# Altium footprint library ALL.PcbLib: 153 footprints (part 8 of 11)
Each footprint in its own frame and in the unit in brackets; x right, y up, seen from the top. Pads: shape width x height; smd on the part's side, far side on the other; paste and mask are expansions set on the pad; w line width, h text height; cw(c..) or ccw(c..) is an arc to the next point about the centre after c.
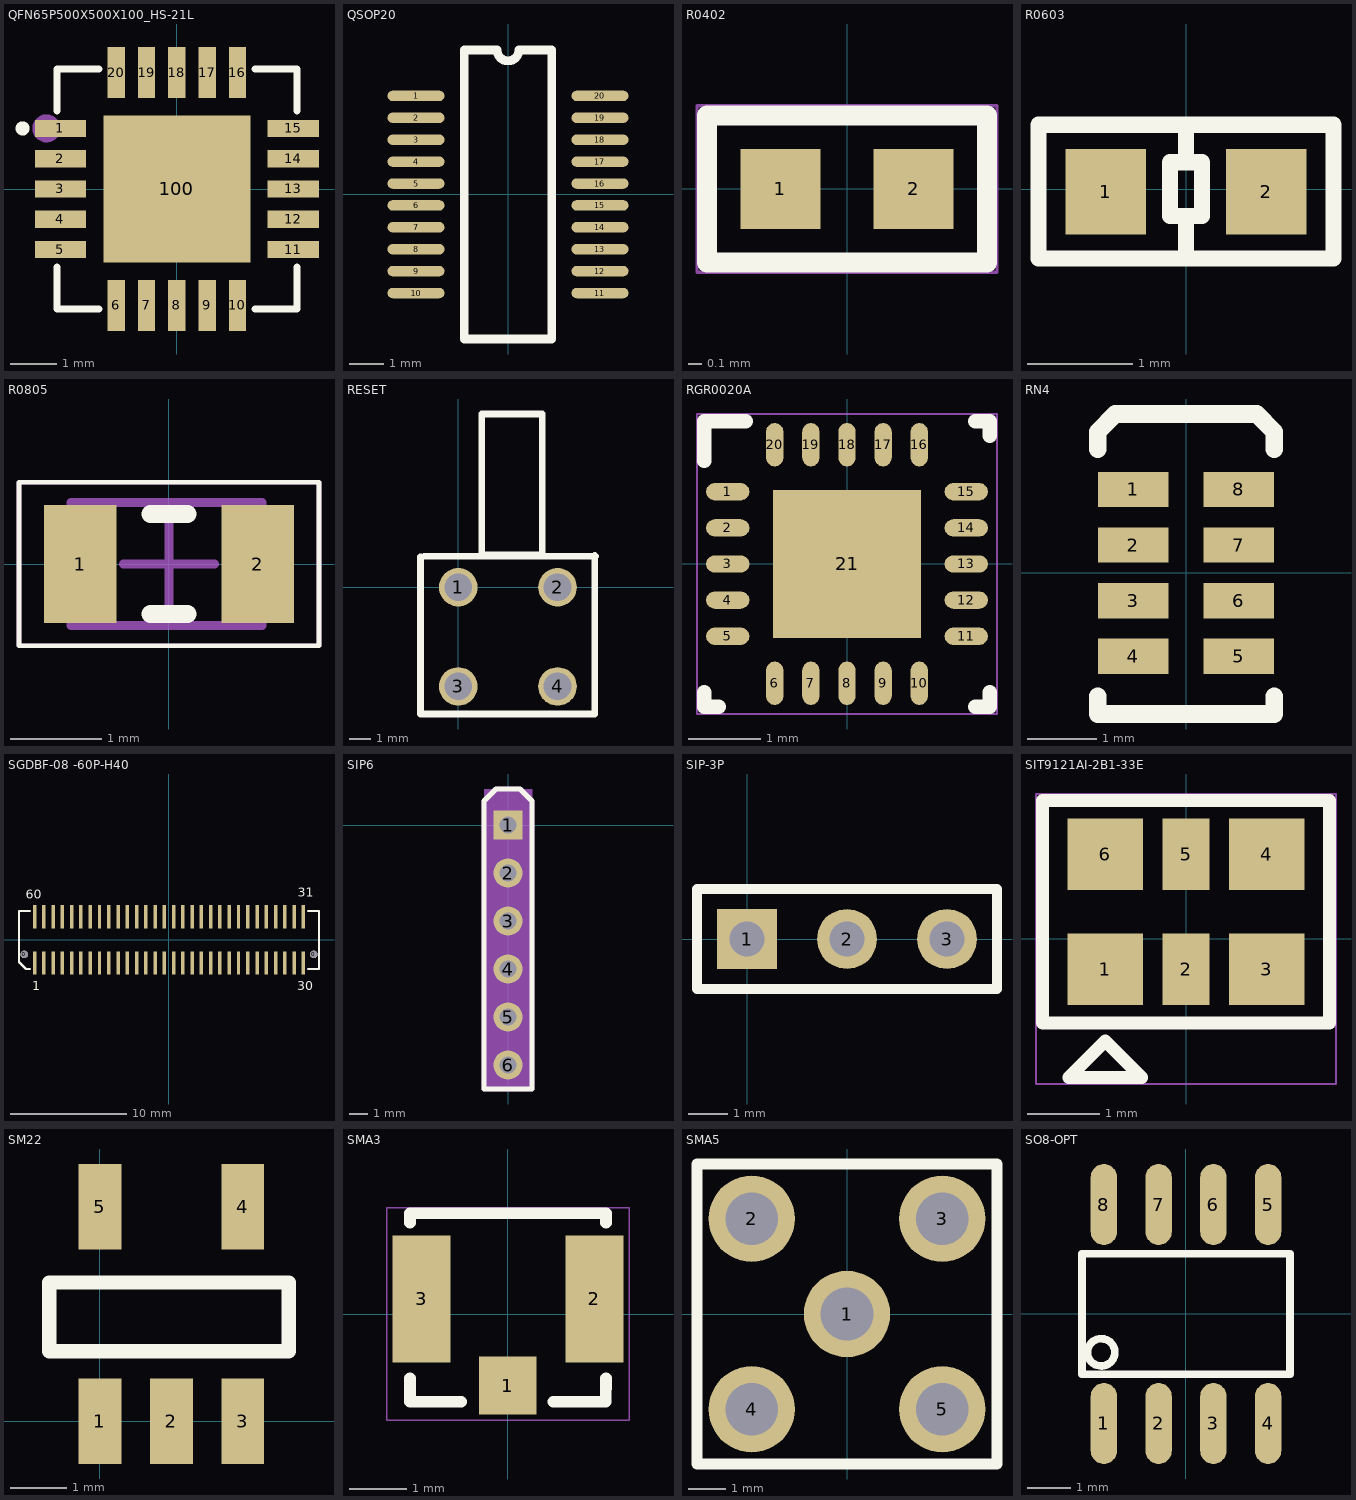
[diagram p7: the footprints below, top view; thin cyan lines are the x and y axes]

## QFN65P500X500X100_HS-21L [mm]
pads (21):
  rect 1.1x0.37 smd: 1(-2.5,1.3) 2(-2.5,0.65) 3(-2.5,0) 4(-2.5,-0.65) 5(-2.5,-1.3) 11(2.5,-1.3) 12(2.5,-0.65) 13(2.5,0) 14(2.5,0.65) 15(2.5,1.3)
  rect 0.37x1.1 smd: 6(-1.3,-2.5) 7(-0.65,-2.5) 8(0,-2.5) 9(0.65,-2.5) 10(1.3,-2.5) 16(1.3,2.5) 17(0.65,2.5) 18(0,2.5) 19(-0.65,2.5) 20(-1.3,2.5)
  rect 3.15x3.15 smd: 100(0,0)
Top Overlay:
  circle w0.153: c-3.312,1.3 r0.076
  lines w0.152: -2.576,-1.672 -2.576,-2.576 -1.673,-2.576 ; -2.576,1.673 -2.576,2.576 -1.673,2.576 ; 1.672,-2.576 2.576,-2.576 2.576,-1.672 ; 1.672,2.576 2.576,2.576 2.576,1.673
Top Paste:
  region: -1.26,1.26 1.26,1.26 1.26,-1.26 -1.26,-1.26
Mechanical 15:
  circle w0.3: c-2.8,1.3 r0.15

## QSOP20 [mil]
pads (20):
  oval 65x12 smd: 1(-105,112.5) 2(-105,87.5) 3(-105,62.5) 4(-105,37.5) 5(-105,12.5) 6(-105,-12.5) 7(-105,-37.5) 8(-105,-62.5) 9(-105,-87.5) 10(-105,-112.5) 11(105,-112.5) 12(105,-87.5) 13(105,-62.5) 14(105,-37.5) 15(105,-12.5) 16(105,12.5) 17(105,37.5) 18(105,62.5) 19(105,87.5) 20(105,112.5)
Top Overlay:
  lines w10: -50,-165 50,-165 50,165 12.5,165 cw(c0,165) -12.5,165 -50,165 -50,-165

## R0402 [mm] "R0402"
pads (2):
  rect 0.6x0.6 smd: 1(-0.5,0) 2(0.5,0)
Top Overlay:
  lines w0.15: -1.05,-0.55 1.05,-0.55 1.05,0.55 -1.05,0.55 -1.05,-0.55
  text ".Designator" at 2.667,-0.597 h0.76
Mechanical 7:
  lines w0.025: -1.125,-0.625 1.125,-0.625 1.125,0.625 -1.125,0.625 -1.125,-0.625

## R0603 [mil] "R0603"
pads (2):
  rect 30x32 smd: 1(-30,-1) 2(30,-1)
Top Overlay:
  lines w6: 0,-26 0,-11 ; 0,23 0,10 ; 0,10 -6,10 -6,-10 6,-10 6,10 0,10 ; -55,-26 55,-26 55,24 -55,24 -55,-26
Mechanical 7:
  lines w1: -56,-26 56,-26 56,26 -56,26 -56,-26
Mechanical 16:
  text ".Designator" at 0,-1 h30

## R0805 [mm]
height 0.5
pads (2):
  rect 0.8x1.3 smd: 1(-0.975,0) 2(0.975,0)
Top Overlay:
  lines w0.05: -1.65,-0.9 1.65,-0.9 1.65,0.9 -1.65,0.9 -1.65,-0.9
  lines w0.2: -0.2,-0.55 0.2,-0.55 ; -0.2,0.55 0.2,0.55
Mechanical 13:
  lines w0.1: -1.075,-0.675 -1.075,0.675 1.025,0.675 1.025,-0.675 -1.075,-0.675
Mechanical 15:
  lines w0.05: -1.65,-0.9 1.65,-0.9 1.65,0.9 -1.65,0.9 -1.65,-0.9
  lines w0.1: -0.5,0 0.5,0 ; 0,-0.5 0,0.5
3D body "R0805.STEP": height 0.55, standoff 0, extent -1.025,-0.63 0.975,0.63

## RESET [mil]
pads (4):
  round 70 / inner round 60 / far side round 60 hole 50: 1(0,0) 2(180,0)
  round 70 hole 50: 3(0,-180) 4(180,-180)
Top Overlay:
  lines w12: -68.68,55.49 -68.68,-230 247.8,-230 247.8,57.69 ; -62.09,56.59 248.9,56.59 ; 42.31,58.79 42.31,314.58 152.2,314.58 152.2,58.79 46.7,58.79

## RGR0020A [mm] "RGR0020A"
pads (21):
  oval 0.6x0.24 smd: 1(-1.65,1) 2(-1.65,0.5) 3(-1.65,0) 4(-1.65,-0.5) 5(-1.65,-1) 11(1.65,-1) 12(1.65,-0.5) 13(1.65,0) 14(1.65,0.5) 15(1.65,1)
  oval 0.24x0.6 smd: 6(-1,-1.65) 7(-0.5,-1.65) 8(0,-1.65) 9(0.5,-1.65) 10(1,-1.65) 16(1,1.65) 17(0.5,1.65) 18(0,1.65) 19(-0.5,1.65) 20(-1,1.65)
  rect 2.05x2.05 smd: 21(0,0)
Top Overlay:
  lines w0.2: -1.975,-1.775 -1.975,-1.975 -1.775,-1.975 ; -1.975,1.425 -1.975,1.975 -1.4,1.975 ; 1.775,-1.975 1.975,-1.975 1.975,-1.775 ; 1.775,1.975 1.975,1.975 1.975,1.775
Mechanical 7:
  lines w0.025: -2.075,-2.075 2.075,-2.075 2.075,2.075 -2.075,2.075 -2.075,-2.075
Mechanical 16:
  text ".Designator" at 0,0 h0.76

## RN4 [mil]
pads (8):
  rect 40x20 smd: 1(-30,47.25) 2(-30,15.75) 3(-30,-15.75) 4(-30,-47.25) 5(30,-47.25) 6(30,-15.75) 7(30,15.75) 8(30,47.25)
Top Overlay:
  lines w10: -50,-70 -50,-80 50,-80 50,-70 ; -50,70 -50,80 -40,90 40,90 50,80 50,70

## SGDBF-08 -60P-H40 [mm]
pads (62):
  oval 0.654x0.65 hole 0.65: 0(-12.5,-1.25) 0(12.5,-1.25)
  rect 0.3x2 smd: 1(-11.6,-2) 2(-10.8,-2) 3(-10,-2) 4(-9.2,-2) 5(-8.4,-2) 6(-7.6,-2) 7(-6.8,-2) 8(-6,-2) 9(-5.2,-2) 10(-4.4,-2) 11(-3.6,-2) 12(-2.8,-2) 13(-2,-2) 14(-1.2,-2) 15(-0.4,-2) 16(0.4,-2) 17(1.2,-2) 18(2,-2) 19(2.8,-2) 20(3.6,-2) 21(4.4,-2) 22(5.2,-2) 23(6,-2) 24(6.8,-2) 25(7.6,-2) 26(8.4,-2) 27(9.2,-2) 28(10,-2) 29(10.8,-2) 30(11.6,-2) 31(11.6,2) 32(10.8,2) 33(10,2) 34(9.2,2) 35(8.4,2) 36(7.6,2) 37(6.8,2) 38(6,2) 39(5.2,2) 40(4.4,2) 41(3.6,2) 42(2.8,2) 43(2,2) 44(1.2,2) 45(0.4,2) 46(-0.4,2) 47(-1.2,2) 48(-2,2) 49(-2.8,2) 50(-3.6,2) 51(-4.4,2) 52(-5.2,2) 53(-6,2) 54(-6.8,2) 55(-7.6,2) 56(-8.4,2) 57(-9.2,2) 58(-10,2) 59(-10.8,2) 60(-11.6,2)
Top Overlay:
  lines w0.203: -12.036,-2.5 -12.348,-2.5 -12.95,-1.898 -12.95,2.5 -12.036,2.5 ; 12.036,-2.5 12.95,-2.5 12.95,2.5 12.036,2.5
  text "31" at 11.121,3.723 h0.8
  text "30" at 11.07,-4.329 h0.8
  text "1" at -11.815,-4.354 h0.8
  text "60" at -12.374,3.571 h0.8

## SIP6 [mil] "SIP6"
pads (6):
  rect 60x60 / inner rect 55x55 / far side rect 60x60 hole 36: 1(0,0)
  round 60 / inner round 55 / far side round 60 hole 36: 2(0,-100) 3(0,-200) 4(0,-300) 5(0,-400) 6(0,-500)
Top Overlay:
  lines w10: -50,-550 50,-550 50,50 25,75 -25,75 -50,50 -50,-550
Mechanical 5:
  lines w10: -50,-550 50,-550 50,50 25,75 -25,75 -50,50 -50,-550
Mechanical 14:
  text "2" at 8,-100 h10
  text "1" at 8,0 h10
  text "5" at 8,-400 h10
  text "3" at 8,-200 h10
  text "6" at 8,-500 h10
  text "4" at 8,-300 h10
Mechanical 16:
  region: -50,-550 50,-550 50,75 -50,75
  lines w1: -50,-550 50,-550 50,50 25,75 -25,75 -50,50 -50,-550
Mechanical 17:
  text "***" at 9,-447 h25
3D body: height 150, standoff 0, extent -50,-550 50,75

## SIP-3P [mil]
pads (3):
  rect 60x60 / inner round 60 / far side rect 60x60 hole 35: 1(0,0)
  round 60 hole 35: 2(100,0) 3(200,0)
Top Overlay:
  lines w10: -50,-50 -50,50 250,50 250,-50 -50,-50

## SIT9121AI-2B1-33E [mm] "SIT9121AI-2B1-33E"
pads (6):
  rect 1.05x1 smd: 1(-1.125,-0.421) 3(1.125,-0.421) 4(1.125,1.179) 6(-1.125,1.179)
  rect 0.65x1 smd: 2(0,-0.421) 5(0,1.179)
Top Overlay:
  lines w0.178: -2,-1.171 -2,1.929 2,1.929 2,-1.171 -2,-1.171 ; -1.633,-1.929 -1.125,-1.421 -0.617,-1.929 -1.633,-1.929
Mechanical 7:
  lines w0.025: -2.089,-2.018 -2.089,2.018 2.089,2.018 2.089,-2.018 -2.089,-2.018
Mechanical 16:
  text ".Designator" at -1.125,-0.421 h0.76

## SM22 [mil]
pads (5):
  rect 30x60 smd: 1(0,0) 2(50,0) 3(100,0) 4(100,150) 5(0,150)
Top Overlay:
  lines w10: -35.38,48.92 -35.38,97 132.13,97 132.13,48.92 -35.38,48.92

## SMA3 [mm] "SMA3"
pads (3):
  rect 1x1 smd: 1(-0.005,-1.239)
  rect 1x2.2 smd: 2(1.495,0.261) 3(-1.495,0.261)
Top Overlay:
  lines w0.2: -1.695,-1.111 -1.695,-1.519 -0.805,-1.519 ; -1.695,1.582 -1.695,1.741 1.695,1.741 1.695,1.581 ; 0.785,-1.519 1.695,-1.519 1.695,-1.111
Mechanical 7:
  lines w0.025: -2.097,-1.841 2.097,-1.841 2.097,1.841 -2.097,1.841 -2.097,-1.841
Mechanical 16:
  text ".Designator" at -0.005,0.261 h0.76

## SMA5 [mm]
pads (5):
  round 2.3 hole 1.4: 1(0,0) 2(-2.54,2.54) 3(2.54,2.54) 4(-2.54,-2.54) 5(2.54,-2.54)
Top Overlay:
  lines w0.305: -4,-4 -4,4 4,4 4,-4 -4,-4

## SO8-OPT [mil]
pads (8):
  oval 24x74 smd: 1(-75,-100) 2(-25,-100) 3(25,-100) 4(75,-100) 5(75,100) 6(25,100) 7(-25,100) 8(-75,100)
Top Overlay:
  circle w7: c-77.5,-35 r12.5
  lines w7: -95,-55 -95,55 95,55 95,-55 -95,-55